# Altium integrated library ICs.IntLib: 88 symbols (part 2 of 2)
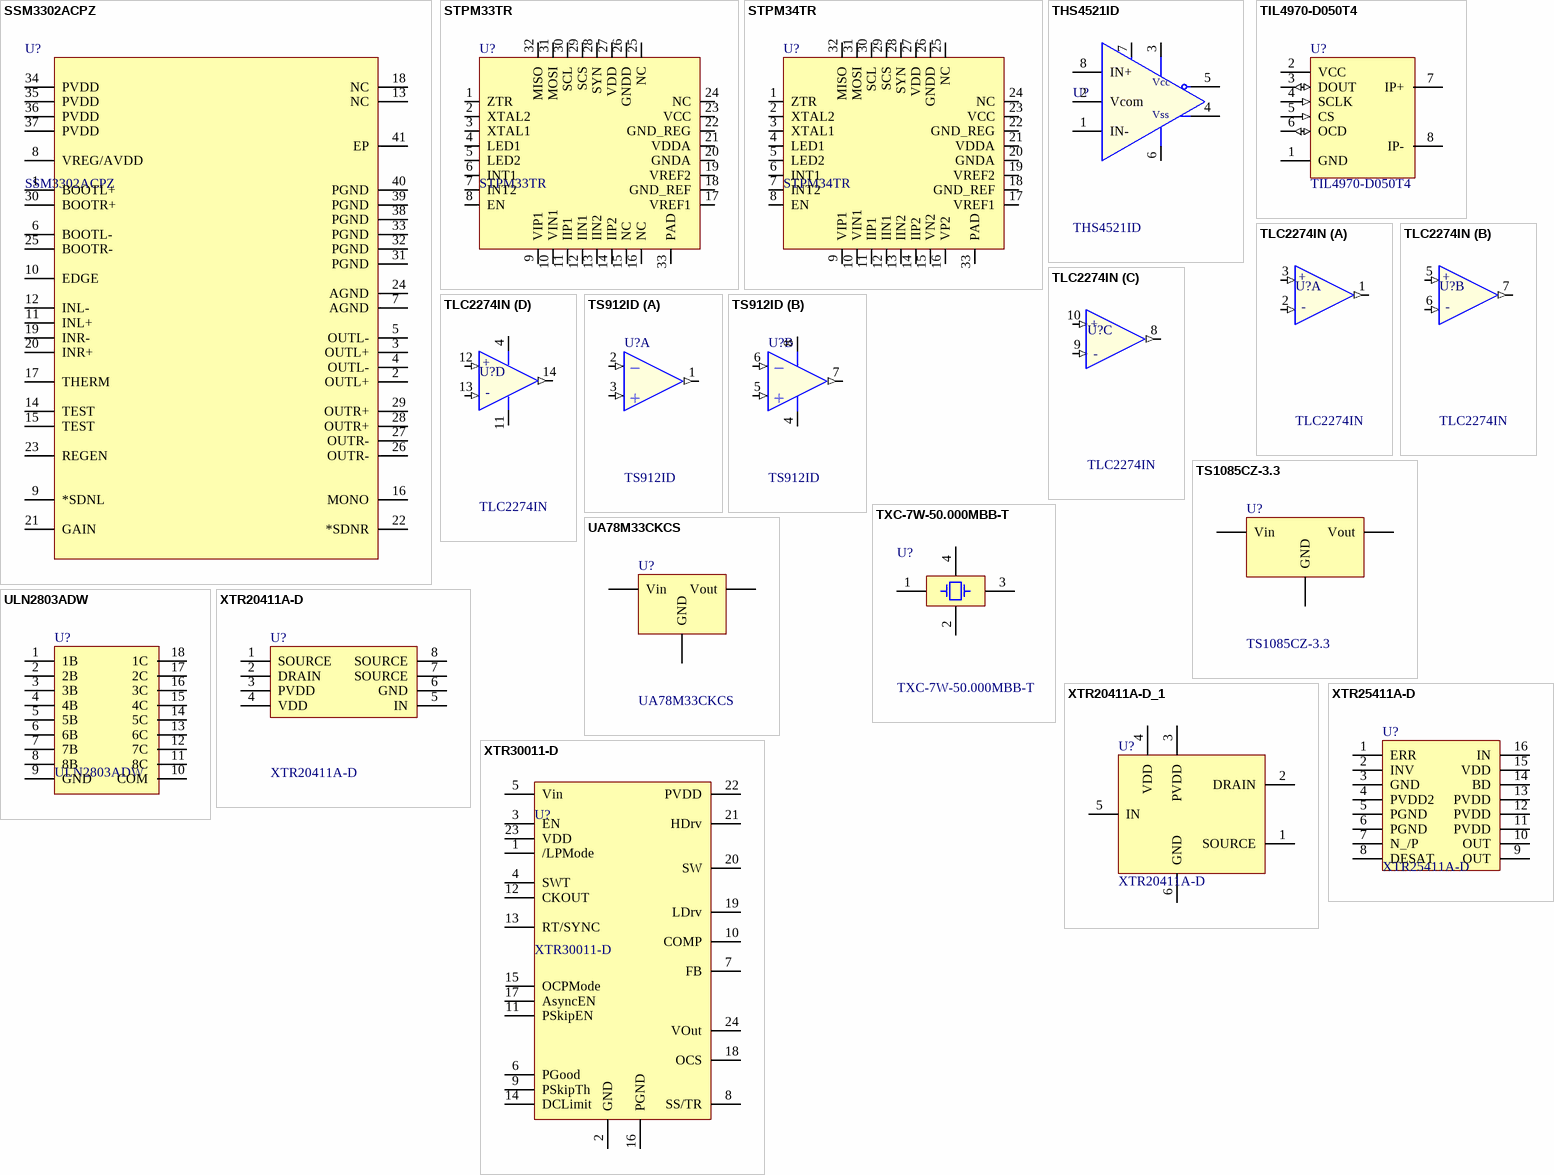
[diagram p10: symbols SSM3302ACPZ to XTR30011-D]

## SSM3302ACPZ
designator U?
digital power amp, audio; Deliverer PartNr: 2099721; Manufacturer: ADI; Deliverer: Farnell; TDE-PN: IC0025; Published: 26.03.2014; PackageDescription: LFCSP-WQ-40; Publisher: Sebastian Kulik; Manufacturer PartNr: SSM3302ACPZ
footprint LFCSP-WQ-40
pins: 1 BOOTL+, 2 OUTL+, 3 OUTL+, 4 OUTL-, 5 OUTL-, 6 BOOTL-, 7 AGND, 8 VREG/AVDD, 9 *SDNL, 10 EDGE, 11 INL+, 12 INL-, 13 NC, 14 TEST, 15 TEST, 16 MONO, 17 THERM, 18 NC, 19 INR-, 20 INR+, 21 GAIN, 22 *SDNR, 23 REGEN, 24 AGND, 25 BOOTR-, 26 OUTR-, 27 OUTR-, 28 OUTR+, 29 OUTR+, 30 BOOTR+, 31 PGND, 32 PGND, 33 PGND, 34 PVDD, 35 PVDD, 36 PVDD, 37 PVDD, 38 PGND, 39 PGND, 40 PGND, 41 EP

## STPM33TR
designator U?
1 phase voltage/current measuring device; Manufacturer: STMicro; Deliverer: EBV; TDE-PN: IC0060; Published: 10.12.2014; Deliverer PartNr: STPM33TR; PackageDescription: QFN32L; Publisher: Sebastian Kulik; Manufacturer PartNr: STPM33TR
footprint QFN32_L (32-Pin Quad Flat Pack 0.5 mm Pitch, IPC High Density)
footprint QFN32_L-Vias (32-Pin Quad Flat Pack 0.5 mm Pitch, IPC High Density)
pins: 1 ZTR, 2 XTAL2, 3 XTAL1, 4 LED1, 5 LED2, 6 INT1, 7 INT2, 8 EN (power), 9 VIP1, 10 VIN1, 11 IIP1, 12 IIN1, 13 IIN2, 14 IIP2, 15 NC, 16 NC (power), 17 VREF1, 18 GND_REF, 19 VREF2, 20 GNDA, 21 VDDA, 22 GND_REG, 23 VCC, 24 NC (power), 25 NC, 26 GNDD, 27 VDD, 28 SYN, 29 SCS, 30 SCL, 31 MOSI, 32 MISO (power), 33 PAD (power)

## STPM34TR
designator U?
2 phase voltage/current measuring device; Manufacturer: STMicro; Deliverer: EBV; TDE-PN: IC0064; Published: 10.12.2014; Deliverer PartNr: STPM34TR; PackageDescription: QFN32L; Publisher: Sebastian Kulik; Manufacturer PartNr: STPM34TR
footprint QFN32_L (32-Pin Quad Flat Pack 0.5 mm Pitch, IPC High Density)
footprint QFN32_L-Vias (32-Pin Quad Flat Pack 0.5 mm Pitch, IPC High Density)
pins: 1 ZTR, 2 XTAL2, 3 XTAL1, 4 LED1, 5 LED2, 6 INT1, 7 INT2, 8 EN (power), 9 VIP1, 10 VIN1, 11 IIP1, 12 IIN1, 13 IIN2, 14 IIP2, 15 VN2, 16 VP2 (power), 17 VREF1, 18 GND_REF, 19 VREF2, 20 GNDA, 21 VDDA, 22 GND_REG, 23 VCC, 24 NC (power), 25 NC, 26 GNDD, 27 VDD, 28 SYN, 29 SCS, 30 SCL, 31 MOSI, 32 MISO (power), 33 PAD (power)

## THS4521ID
designator U?
Fully differential OP, 50MHz; Deliverer PartNr: 709-2867; Manufacturer: TI; Deliverer: RS; TDE-PN: IC00073; Published: 15.04.2016; PackageDescription: TSSOP8; Publisher: Sebastian Kulik; Manufacturer PartNr: THS4521ID; Price: 3.29
footprint TSSOP8 (Shrink Small Outline, Plastic, Thin; 8 Leads; Body Width 4.4 mm; Pitch 0.65 mm)
footprint SOIC8_N (SOIC, 8-Leads, Body 4.9x3.9mm, Pitch 1.27mm, IPC Medium Density)
footprint SOP8_L (SOIC, 8-Leads, Body 4.9x3.9mm, Pitch 1.27mm, IPC High Density)
pins: 1 IN-, 2 Vcom, 3 Vcc, 4 OUT-, 5 OUT+ (power), 6 Vss, 7 PD, 8 IN+ (power)

## TIL4970-D050T4
designator U?
Current sensor, SPI; Deliverer PartNr: TLI4970-D050T4; Manufacturer: Infenion; Deliverer: EBV; TDE-PN: IC0045; Published: 28.04.2014; PackageDescription: TISON-8-1; Publisher: Sebastian Kulik; Manufacturer PartNr: TLI4970-D050T4
footprint TISON-8-1
pins: 1 GND (power), 2 VCC (power), 3 DOUT (io), 4 SCLK (in), 5 CS (in), 6 OCD (io), 7 IP+ (power), 8 IP- (power)

## TLC2274IN
designator U?
Reel to Reel  quad OP; Deliverer PartNr: 331-2182; Manufacturer: TI; Deliverer: RS; TDE-PN: IC0072; Published: 28.03.2014; PackageDescription: TSSOP8; Publisher: Sebastian Kulik; Manufacturer PartNr: TLC2274IN
footprint DIP-14 (DIP; 14 Leads; Row Spacing 7.62 mm; Pitch 2.54 mm)
part A pins: 1 OUT (out), 2 IN+ (in), 3 IN- (in)
part B pins: 5 IN- (in), 6 IN+ (in), 7 OUT (out)
part C pins: 8 OUT (out), 9 IN+ (in), 10 IN- (in)
part D pins: 4 V+ (power), 11 V- (power), 12 IN- (in), 13 IN+ (in), 14 OUT (out)
part A text: +; -
part B text: +; -
part C text: +; -
part D text: +; -

## TS912ID
designator U?
Reel to Reel  dual OP; Deliverer PartNr: 1094386; Manufacturer: ST; Deliverer: Farnell; TDE-PN: IC0027; Published: 28.03.2014; PackageDescription: TSSOP8; Publisher: Sebastian Kulik; Manufacturer PartNr: TS912ID
footprint SOP8_L (SOIC, 8-Leads, Body 4.9x3.9mm, Pitch 1.27mm, IPC High Density)
part A pins: 1 OUT (out), 2 IN- (in), 3 IN+ (in)
part B pins: 4 V- (power), 5 IN+ (in), 6 IN- (in), 7 OUT (out), 8 V+ (power)

## TS1085CZ-3.3
designator U?
LDO, 3.3V; Deliverer PartNr: 7208286; Manufacturer: Taiwan Semi; Deliverer: Farnell; TDE-PN: IC0056; Published: 04.11.2014; PackageDescription: TS1084_HOCH; Publisher: Sebastian Kulik; Manufacturer PartNr: TS1085CZ-3.3
footprint TS1084_HOCH
pins: GND, IN Vin, OUT Vout (power)

## TXC-7W-50.000MBB-T
designator U?
Crystal; Deliverer PartNr: 1842144; Manufacturer: TXC; Deliverer: Farnell; TDE-PN: IC0037; Published: 17.02.2014; PackageDescription: TXC_7W; Publisher: Sebastian Kulik; Manufacturer PartNr: 7W-50.000MBB-T
footprint TXC_7W
pins: 1 E/D, 2 GND, 3 OSC2, 4 VCC

## UA78M33CKCS
designator U?
LDO, 3.3V; Deliverer PartNr: 595-UA78M33CKCS; Manufacturer: TI; Deliverer: Mouser; TDE-PN: IC0059; Published: 11.11.2014; PackageDescription: TO220-3; Publisher: Sebastian Kulik; Manufacturer PartNr: UA78M33CKCS
footprint TO220-3
pins: GND, VIN Vin, VOUT Vout (power)

## ULN2803ADW
designator U?
Darlington array, 50V; Deliverer PartNr: 1652419; Manufacturer: TI; Deliverer: Farnell; TDE-PN: IC0043; Published: 13.03.2014; PackageDescription: SOIC18-WIDE; Publisher: Sebastian Kulik; Manufacturer PartNr: ULN2803ADW
footprint SOIC18-WIDE (SOIC, 18-Leads)
pins: 1 1B, 2 2B, 3 3B, 4 4B, 5 5B, 6 6B, 7 7B, 8 8B, 9 GND, 10 COM, 11 8C, 12 7C, 13 6C, 14 5C, 15 4C, 16 3C, 17 2C, 18 1C

## XTR20411A-D
designator U?
Gate driver; Manufacturer: X-Rel; Deliverer: ProTec; TDE-PN: IC0068; Published: 08.12.2015; Deliverer PartNr: XTR20411A-D; PackageDescription: DIP-8-Ceramic-HT; Publisher: Sebastian Kulik; Manufacturer PartNr: XTR20411A-D
footprint DIP-8-Ceramic-HT (DIP; 8 Leads; Row Spacing 7.62 mm; Pitch 2.54 mm)
pins: 1 SOURCE, 2 DRAIN, 3 PVDD, 4 VDD, 5 IN, 6 GND, 7 SOURCE, 8 SOURCE

## XTR20411A-D_1
designator U?, comment XTR20411A-D
Gate driver; Manufacturer: X-Rel; Deliverer: ProTec; TDE-PN: IC0068; Published: 08.12.2015; Deliverer PartNr: XTR20411A-D; PackageDescription: DIP-8-Ceramic-HT; Publisher: Sebastian Kulik; Manufacturer PartNr: XTR20411A-D
footprint DIP-8-Ceramic-HT - duplicate (DIP; 8 Leads; Row Spacing 7.62 mm; Pitch 2.54 mm)
pins: 1 SOURCE, 2 DRAIN, 3 PVDD, 4 VDD, 5 IN, 6 GND

## XTR25411A-D
designator U?
Gate driver; Manufacturer: X-Rel; Deliverer: ProTec; TDE-PN: IC0067; Published: 08.12.2015; Deliverer PartNr: XTR25411A-D; PackageDescription: DIP-16-Ceramic-HT; Publisher: Sebastian Kulik; Manufacturer PartNr: XTR25411A-D
footprint DIP-16-Ceramic-HT (Footprint not found)
pins: 1 ERR, 2 INV, 3 GND, 4 PVDD2, 5 PGND, 6 PGND, 7 N_/P, 8 DESAT, 9 OUT, 10 OUT, 11 PVDD, 12 PVDD, 13 PVDD, 14 BD, 15 VDD, 16 IN

## XTR30011-D
designator U?
HT PWM controller; Manufacturer: X-Rel; Deliverer: ProTec; TDE-PN: IC0071; Published: 16.02.2016; Deliverer PartNr: XTR30011-D; PackageDescription: DIP24; Publisher: Sebastian Kulik; Manufacturer PartNr: XTR30011-D
footprint DIP-24-Ceramic-HT (DIP; 24 Leads; Row Spacing 7.62 mm; Pitch 2.54 mm)
pins: 1 /LPMode, 2 GND, 3 EN, 4 SWT, 5 Vin, 6 PGood (power), 7 FB, 8 SS/TR, 9 PSkipTh (power), 10 COMP, 11 PSkipEN (power), 12 CKOUT, 13 RT/SYNC, 14 DCLimit (power), 15 OCPMode (power), 16 PGND, 17 AsyncEN (power), 18 OCS, 19 LDrv, 20 SW, 21 HDrv, 22 PVDD, 23 VDD, 24 VOut